# Altium integrated library LEMO Unipole And Multipole Type Connectors.IntLib: 1566 symbols (part 8 of 13) (continued)
## PKA.M1.0GL.VG
designator J?
Fixed receptacle with two nuts (back panel mounting), 90° print contacts, Key (A), P series, Multipole Type with 10 Contacts; Manufacturer: LEMO; PartNumber: PKA.M1.0GL.VG; Number of contacts: 10; Contact Diameter: 0.5 mm; Test voltage (kV rms) Contact-Contact: 0.85; Rated Current(A): 3; DatasheetVersion: Jun-14; PackageReference: PKA.M1.0GL.VG; PackageDescription: Fixed receptacle with two nuts (back panel mounting), 90° print contacts, Key(A) for Printed Circuit; ComponentLink1Description: Manufacturer URL; ComponentLink1URL: http://www.lemo.com; ComponentLink2Description: Datasheet; ComponentLink2URL: http://intra.lemo.ch/catalog/ROW/UK_English/P_series_catalog.pdf
footprint PKA.M1.0GL.VG (Socket, Female, Height 33.5 mm, Through hole)
pins: 1, 2, 3, 4, 5, 6, 7, 8, 9, 10

## PKA.M1.0GL.VJ
designator J?
Fixed receptacle with two nuts (back panel mounting), 90° print contacts, Key (A), P series, Multipole Type with 10 Contacts; Manufacturer: LEMO; PartNumber: PKA.M1.0GL.VJ; Number of contacts: 10; Contact Diameter: 0.5 mm; Test voltage (kV rms) Contact-Contact: 0.85; Rated Current(A): 3; DatasheetVersion: Jun-14; PackageReference: PKA.M1.0GL.VJ; PackageDescription: Fixed receptacle with two nuts (back panel mounting), 90° print contacts, Key(A) for Printed Circuit; ComponentLink1Description: Manufacturer URL; ComponentLink1URL: http://www.lemo.com; ComponentLink2Description: Datasheet; ComponentLink2URL: http://intra.lemo.ch/catalog/ROW/UK_English/P_series_catalog.pdf
footprint PKA.M1.0GL.VJ (Socket, Female, Height 33.5 mm, Through hole)
pins: 1, 2, 3, 4, 5, 6, 7, 8, 9, 10

## PKA.M1.0GL.VR
designator J?
Fixed receptacle with two nuts (back panel mounting), 90° print contacts, Key (A), P series, Multipole Type with 10 Contacts; Manufacturer: LEMO; PartNumber: PKA.M1.0GL.VR; Number of contacts: 10; Contact Diameter: 0.5 mm; Test voltage (kV rms) Contact-Contact: 0.85; Rated Current(A): 3; DatasheetVersion: Jun-14; PackageReference: PKA.M1.0GL.VR; PackageDescription: Fixed receptacle with two nuts (back panel mounting), 90° print contacts, Key(A) for Printed Circuit; ComponentLink1Description: Manufacturer URL; ComponentLink1URL: http://www.lemo.com; ComponentLink2Description: Datasheet; ComponentLink2URL: http://intra.lemo.ch/catalog/ROW/UK_English/P_series_catalog.pdf
footprint PKA.M1.0GL.VR (Socket, Female, Height 33.5 mm, Through hole)
pins: 1, 2, 3, 4, 5, 6, 7, 8, 9, 10

## PKA.M1.0GL.VZ
designator J?
Fixed receptacle with 1 nut (without 2nd front nut), Key (A), P series, Multipole Type with 10 Contacts; Manufacturer: LEMO; PartNumber: PKA.M1.0GL.VZ; Number of contacts: 10; Contact Diameter: 0.5 mm; Test voltage (kV rms) Contact-Contact: 0.85; Rated Current(A): 3; DatasheetVersion: Jun-14; PackageReference: PKA.M1.0GL.VZ; PackageDescription: Fixed receptacle with 1 nut (without 2nd front nut), Key(A) for Printed Circuit; ComponentLink1Description: Manufacturer URL; ComponentLink1URL: http://www.lemo.com; ComponentLink2Description: Datasheet; ComponentLink2URL: http://intra.lemo.ch/catalog/ROW/UK_English/P_series_catalog.pdf
footprint PKA.M1.0GL.VZ (Socket, Female, Height 33.5 mm, Through hole)
pins: 1, 2, 3, 4, 5, 6, 7, 8, 9, 10

## PKA.M1.0NL.NG
designator J?
Fixed receptacle with two nuts (back panel mounting), straight print contacts, Key (A), P series, Multipole Type with 10 Contacts; Manufacturer: LEMO; PartNumber: PKA.M1.0NL.NG; Number of contacts: 10; Contact Diameter: 0.5 mm; Test voltage (kV rms) Contact-Contact: 0.85; Rated Current(A): 3; DatasheetVersion: Jun-14; PackageReference: PKA.M1.0NL.NG; PackageDescription: Fixed receptacle with two nuts (back panel mounting), straight print contacts, Key(A) for Printed Circuit; ComponentLink1Description: Manufacturer URL; ComponentLink1URL: http://www.lemo.com; ComponentLink2Description: Datasheet; ComponentLink2URL: http://intra.lemo.ch/catalog/ROW/UK_English/P_series_catalog.pdf
footprint PKA.M1.0NL.NG (Socket, Female, Height 33.5 mm, Through hole)
pins: 1, 2, 3, 4, 5, 6, 7, 8, 9, 10

## PKA.M1.0NL.VN
designator J?
Fixed receptacle with two nuts (back panel mounting), 90° print contacts, Key (A), P series, Multipole Type with 10 Contacts; Manufacturer: LEMO; PartNumber: PKA.M1.0NL.VN; Number of contacts: 10; Contact Diameter: 0.5 mm; Test voltage (kV rms) Contact-Contact: 0.85; Rated Current(A): 3; DatasheetVersion: Jun-14; PackageReference: PKA.M1.0NL.VN; PackageDescription: Fixed receptacle with two nuts (back panel mounting), 90° print contacts, Key(A) for Printed Circuit; Supplier 1: Mouser; Supplier Part Number 1: 736-PKAM10NLVN; Supplier 2: Digi-Key; Supplier Part Number 2: PKA.M1.0NL.VN-ND; ComponentLink1Description: Manufacturer URL; ComponentLink1URL: http://www.lemo.com; ComponentLink2Description: Datasheet; ComponentLink2URL: http://intra.lemo.ch/catalog/ROW/UK_English/P_series_catalog.pdf
footprint PKA.M1.0NL.VN (Socket, Female, Height 33.5 mm, Through hole)
pins: 1, 2, 3, 4, 5, 6, 7, 8, 9, 10

## PKA.M1.0NL.VZ
designator J?
Fixed receptacle with 1 nut (without 2nd front nut), Key (A), P series, Multipole Type with 10 Contacts; Manufacturer: LEMO; PartNumber: PKA.M1.0NL.VZ; Number of contacts: 10; Contact Diameter: 0.5 mm; Test voltage (kV rms) Contact-Contact: 0.85; Rated Current(A): 3; DatasheetVersion: Jun-14; PackageReference: PKA.M1.0NL.VZ; PackageDescription: Fixed receptacle with 1 nut (without 2nd front nut), Key(A) for Printed Circuit; ComponentLink1Description: Manufacturer URL; ComponentLink1URL: http://www.lemo.com; ComponentLink2Description: Datasheet; ComponentLink2URL: http://intra.lemo.ch/catalog/ROW/UK_English/P_series_catalog.pdf
footprint PKA.M1.0NL.VZ (Socket, Female, Height 33.5 mm, Through hole)
pins: 1, 2, 3, 4, 5, 6, 7, 8, 9, 10

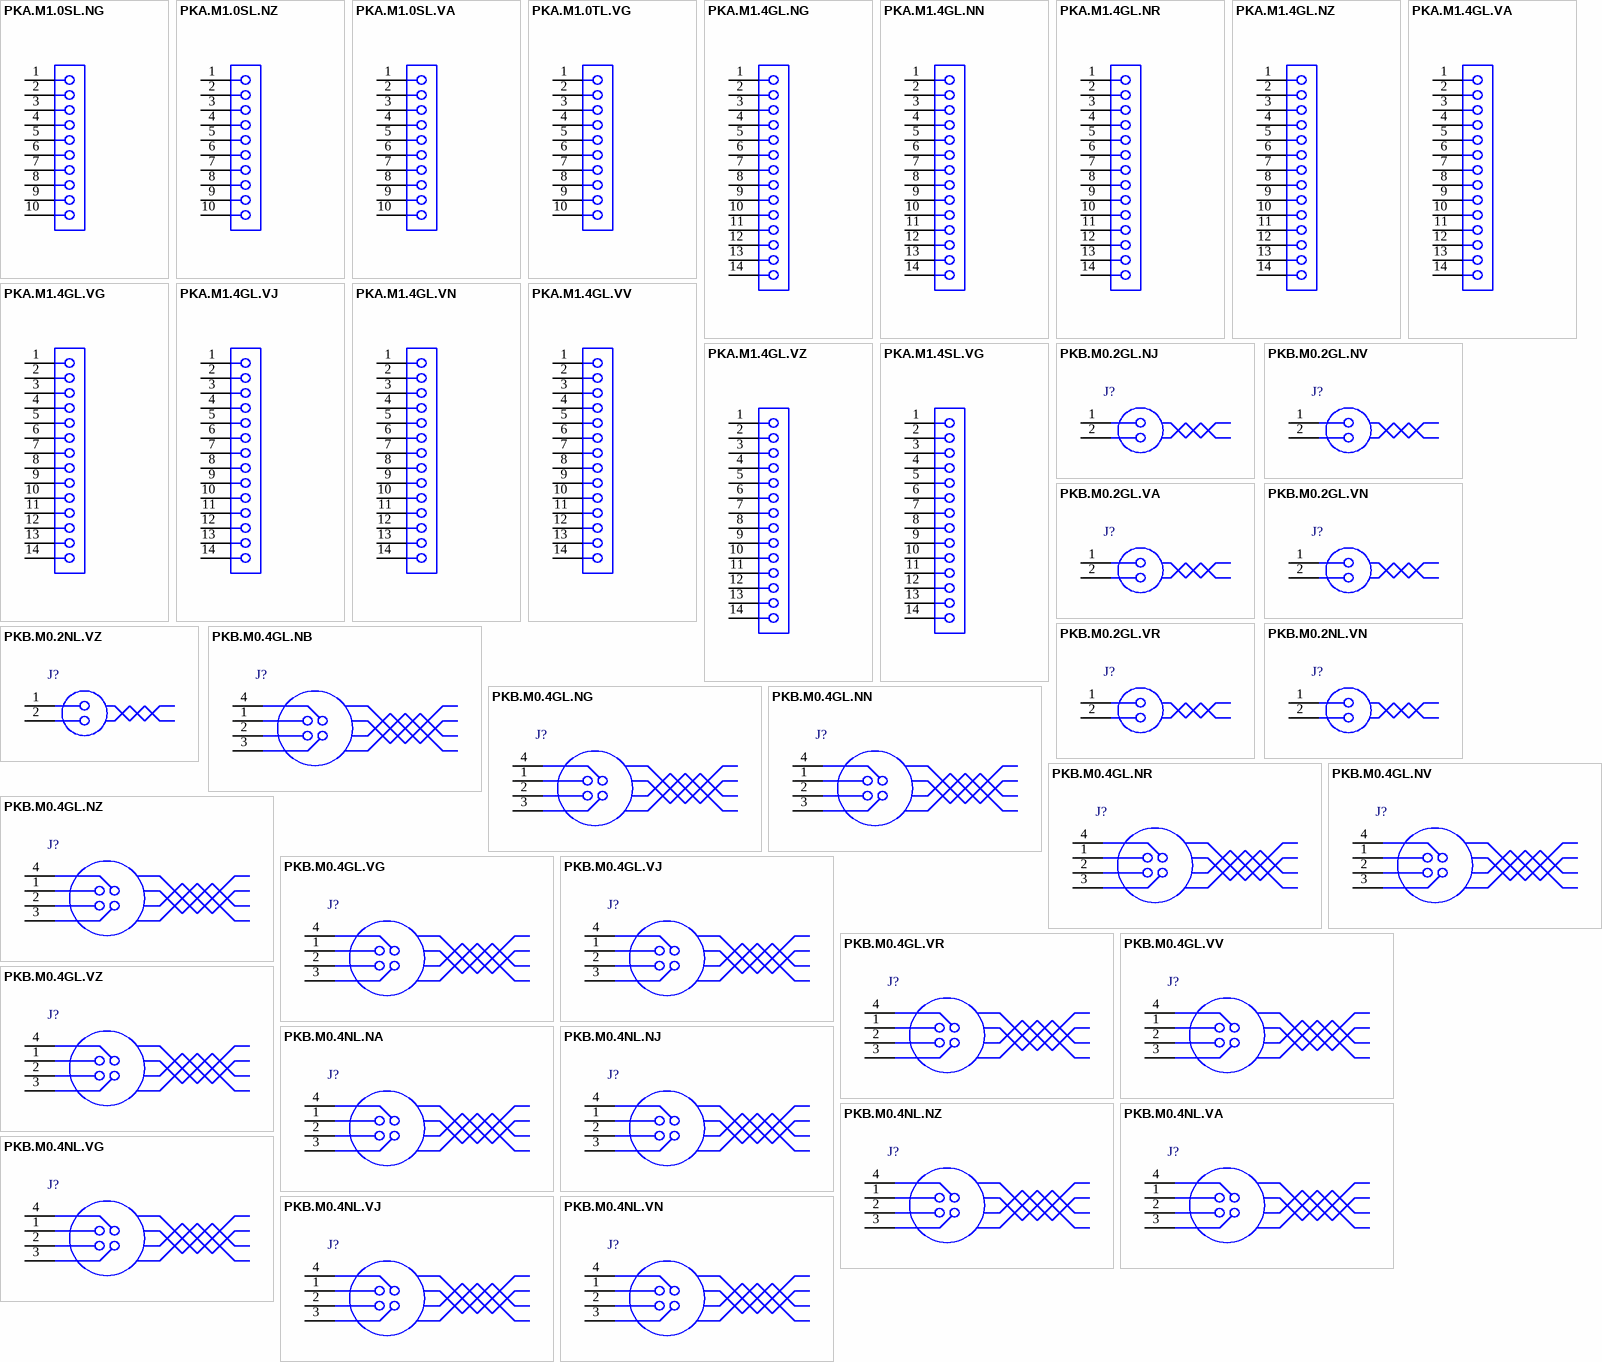
[diagram p27: symbols PKA.M1.0SL.NG to PKB.M0.4NL.VN]

## PKA.M1.0SL.NG
designator J?
Fixed receptacle with two nuts (back panel mounting), straight print contacts, Key (A),  series, Multipole Type with 10 Contacts; Manufacturer: LEMO; PartNumber: PKA.M1.0SL.NG; Number of contacts: 10; Contact Diameter: 0.5 mm; Test voltage (kV rms) Contact-Contact: 0.85; Rated Current(A): 3; DatasheetVersion: Jun-14; PackageReference: PKA.M1.0SL.NG; PackageDescription: Fixed receptacle with two nuts (back panel mounting), straight print contacts, Key(A) for Printed Circuit; Supplier 1: Mouser; Supplier Part Number 1: 736-PKAM10SLNG; Supplier 2: Digi-Key; Supplier Part Number 2: PKA.M1.0SL.NG-ND; ComponentLink1Description: Manufacturer URL; ComponentLink1URL: http://www.lemo.com; ComponentLink2Description: Datasheet; ComponentLink2URL: http://intra.lemo.ch/catalog/ROW/UK_English/P_series_catalog.pdf
footprint PKA.M1.0SL.NG (Socket, Female, Height 33.5 mm, Through hole)
pins: 1, 2, 3, 4, 5, 6, 7, 8, 9, 10

## PKA.M1.0SL.NZ
designator J?
Fixed receptacle with 1 nut (without 2nd front nut), Key (A), P series, Multipole Type with 10 Contacts; Manufacturer: LEMO; PartNumber: PKA.M1.0SL.NZ; Number of contacts: 10; Contact Diameter: 0.5 mm; Test voltage (kV rms) Contact-Contact: 0.85; Rated Current(A): 3; DatasheetVersion: Jun-14; PackageReference: PKA.M1.0SL.NZ; PackageDescription: Fixed receptacle with 1 nut (without 2nd front nut), Key(A) for Printed Circuit; Supplier 1: Mouser; Supplier Part Number 1: 736-PKAM10SLNZ; Supplier 2: Digi-Key; Supplier Part Number 2: PKA.M1.0SL.NZ-ND; ComponentLink1Description: Manufacturer URL; ComponentLink1URL: http://www.lemo.com; ComponentLink2Description: Datasheet; ComponentLink2URL: http://intra.lemo.ch/catalog/ROW/UK_English/P_series_catalog.pdf
footprint PKA.M1.0SL.NZ (Socket, Female, Height 25 mm, Through hole)
pins: 1, 2, 3, 4, 5, 6, 7, 8, 9, 10

## PKA.M1.0SL.VA
designator J?
Fixed receptacle with two nuts (back panel mounting), 90° print contacts, Key (A), P series, Multipole Type with 10 Contacts; Manufacturer: LEMO; PartNumber: PKA.M1.0SL.VA; Number of contacts: 10; Contact Diameter: 0.5 mm; Test voltage (kV rms) Contact-Contact: 0.85; Rated Current(A): 3; DatasheetVersion: Jun-14; PackageReference: PKA.M1.0SL.VA; PackageDescription: Fixed receptacle with two nuts (back panel mounting), 90° print contacts, Key(A) for Printed Circuit; Supplier 1: Mouser; Supplier Part Number 1: 736-PKAM10SLVA; Supplier 2: Digi-Key; Supplier Part Number 2: PKA.M1.0SL.VA-ND; ComponentLink1Description: Manufacturer URL; ComponentLink1URL: http://www.lemo.com; ComponentLink2Description: Datasheet; ComponentLink2URL: http://intra.lemo.ch/catalog/ROW/UK_English/P_series_catalog.pdf
footprint PKA.M1.0SL.VA (Socket, Female, Height 33.5 mm, Through hole)
pins: 1, 2, 3, 4, 5, 6, 7, 8, 9, 10

## PKA.M1.0TL.VG
designator J?
Fixed receptacle with two nuts (back panel mounting), 90° print contacts, Key (A), P series, Multipole Type with 10 Contacts; Manufacturer: LEMO; PartNumber: PKA.M1.0TL.VG; Number of contacts: 10; Contact Diameter: 0.5 mm; Test voltage (kV rms) Contact-Contact: 0.85; Rated Current(A): 3; DatasheetVersion: Jun-14; PackageReference: PKA.M1.0TL.VG; PackageDescription: Fixed receptacle with two nuts (back panel mounting), 90° print contacts, Key(A) for Printed Circuit; Supplier 1: Mouser; Supplier Part Number 1: 736-PKAM10TLVG; Supplier 2: Digi-Key; Supplier Part Number 2: PKA.M1.0TL.VG-ND; ComponentLink1Description: Manufacturer URL; ComponentLink1URL: http://www.lemo.com; ComponentLink2Description: Datasheet; ComponentLink2URL: http://intra.lemo.ch/catalog/ROW/UK_English/P_series_catalog.pdf
footprint PKA.M1.0TL.VG (Socket, Female, Height 33.5 mm, Through hole)
pins: 1, 2, 3, 4, 5, 6, 7, 8, 9, 10

## PKA.M1.4GL.NG
designator J?
Fixed receptacle with two nuts (back panel mounting), straight print contacts, Key (A), P series, Multipole Type with 14 Contacts; Manufacturer: LEMO; PartNumber: PKA.M1.4GL.NG; Number of contacts: 14; Contact Diameter: 0.5 mm; Test voltage (kV rms) Contact-Contact: 0.6; Rated Current(A): 2; DatasheetVersion: Jun-14; PackageReference: PKA.M1.4GL.NG; PackageDescription: Fixed receptacle with two nuts (back panel mounting), straight print contacts, Key(A) for Printed Circuit; ComponentLink1Description: Manufacturer URL; ComponentLink1URL: http://www.lemo.com; ComponentLink2Description: Datasheet; ComponentLink2URL: http://intra.lemo.ch/catalog/ROW/UK_English/P_series_catalog.pdf
footprint PKA.M1.4GL.NG (Socket, Female, Height 33.5 mm, Through hole)
pins: 1, 2, 3, 4, 5, 6, 7, 8, 9, 10, 11, 12, 13, 14

## PKA.M1.4GL.NN
designator J?
Fixed receptacle with two nuts (back panel mounting), straight print contacts, Key (A), P series, Multipole Type with 14 Contacts; Manufacturer: LEMO; PartNumber: PKA.M1.4GL.NN; Number of contacts: 14; Contact Diameter: 0.5 mm; Test voltage (kV rms) Contact-Contact: 0.6; Rated Current(A): 2; DatasheetVersion: Jun-14; PackageReference: PKA.M1.4GL.NN; PackageDescription: Fixed receptacle with two nuts (back panel mounting), straight print contacts, Key(A) for Printed Circuit; ComponentLink1Description: Manufacturer URL; ComponentLink1URL: http://www.lemo.com; ComponentLink2Description: Datasheet; ComponentLink2URL: http://intra.lemo.ch/catalog/ROW/UK_English/P_series_catalog.pdf
footprint PKA.M1.4GL.NN (Socket, Female, Height 33.5 mm, Through hole)
pins: 1, 2, 3, 4, 5, 6, 7, 8, 9, 10, 11, 12, 13, 14

## PKA.M1.4GL.NR
designator J?
Fixed receptacle with two nuts (back panel mounting), straight print contacts, Key (A), P series, Multipole Type with 14 Contacts; Manufacturer: LEMO; PartNumber: PKA.M1.4GL.NR; Number of contacts: 14; Contact Diameter: 0.5 mm; Test voltage (kV rms) Contact-Contact: 0.6; Rated Current(A): 2; DatasheetVersion: Jun-14; PackageReference: PKA.M1.4GL.NR; PackageDescription: Fixed receptacle with two nuts (back panel mounting), straight print contacts, Key(A) for Printed Circuit; ComponentLink1Description: Manufacturer URL; ComponentLink1URL: http://www.lemo.com; ComponentLink2Description: Datasheet; ComponentLink2URL: http://intra.lemo.ch/catalog/ROW/UK_English/P_series_catalog.pdf
footprint PKA.M1.4GL.NR (Socket, Female, Height 33.5 mm, Through hole)
pins: 1, 2, 3, 4, 5, 6, 7, 8, 9, 10, 11, 12, 13, 14

## PKA.M1.4GL.NZ
designator J?
Fixed receptacle with 1 nut (without 2nd front nut), Key (A), P series, Multipole Type with 14 Contacts; Manufacturer: LEMO; PartNumber: PKA.M1.4GL.NZ; Number of contacts: 14; Contact Diameter: 0.5 mm; Test voltage (kV rms) Contact-Contact: 0.6; Rated Current(A): 2; DatasheetVersion: Jun-14; PackageReference: PKA.M1.4GL.NZ; PackageDescription: Fixed receptacle with 1 nut (without 2nd front nut), Key(A) for Printed Circuit; ComponentLink1Description: Manufacturer URL; ComponentLink1URL: http://www.lemo.com; ComponentLink2Description: Datasheet; ComponentLink2URL: http://intra.lemo.ch/catalog/ROW/UK_English/P_series_catalog.pdf
footprint PKA.M1.4GL.NZ (Socket, Female, Height 25 mm, Through hole)
pins: 1, 2, 3, 4, 5, 6, 7, 8, 9, 10, 11, 12, 13, 14

## PKA.M1.4GL.VA
designator J?
Fixed receptacle with two nuts (back panel mounting), 90° print contacts, Key (A), P series, Multipole Type with 14 Contacts; Manufacturer: LEMO; PartNumber: PKA.M1.4GL.VA; Number of contacts: 14; Contact Diameter: 0.5 mm; Test voltage (kV rms) Contact-Contact: 0.6; Rated Current(A): 2; DatasheetVersion: Jun-14; PackageReference: PKA.M1.4GL.VA; PackageDescription: Fixed receptacle with two nuts (back panel mounting), 90° print contacts, Key(A) for Printed Circuit; ComponentLink1Description: Manufacturer URL; ComponentLink1URL: http://www.lemo.com; ComponentLink2Description: Datasheet; ComponentLink2URL: http://intra.lemo.ch/catalog/ROW/UK_English/P_series_catalog.pdf
footprint PKA.M1.4GL.VA (Socket, Female, Height 33.5 mm, Through hole)
pins: 1, 2, 3, 4, 5, 6, 7, 8, 9, 10, 11, 12, 13, 14

## PKA.M1.4GL.VG
designator J?
Fixed receptacle with two nuts (back panel mounting), 90° print contacts, Key (A), P series, Multipole Type with 14 Contacts; Manufacturer: LEMO; PartNumber: PKA.M1.4GL.VG; Number of contacts: 14; Contact Diameter: 0.5 mm; Test voltage (kV rms) Contact-Contact: 0.6; Rated Current(A): 2; DatasheetVersion: Jun-14; PackageReference: PKA.M1.4GL.VG; PackageDescription: Fixed receptacle with two nuts (back panel mounting), 90° print contacts, Key(A) for Printed Circuit; ComponentLink1Description: Manufacturer URL; ComponentLink1URL: http://www.lemo.com; ComponentLink2Description: Datasheet; ComponentLink2URL: http://intra.lemo.ch/catalog/ROW/UK_English/P_series_catalog.pdf
footprint PKA.M1.4GL.VG (Socket, Female, Height 33.5 mm, Through hole)
pins: 1, 2, 3, 4, 5, 6, 7, 8, 9, 10, 11, 12, 13, 14

## PKA.M1.4GL.VJ
designator J?
Fixed receptacle with two nuts (back panel mounting), 90° print contacts, Key (A),  series, Multipole Type with 14 Contacts; Manufacturer: LEMO; PartNumber: PKA.M1.4GL.VJ; Number of contacts: 14; Contact Diameter: 0.5 mm; Test voltage (kV rms) Contact-Contact: 0.6; Rated Current(A): 2; DatasheetVersion: Jun-14; PackageReference: PKA.M1.4GL.VJ; PackageDescription: Fixed receptacle with two nuts (back panel mounting), 90° print contacts, Key(A) for Printed Circuit; ComponentLink1Description: Manufacturer URL; ComponentLink1URL: http://www.lemo.com; ComponentLink2Description: Datasheet; ComponentLink2URL: http://intra.lemo.ch/catalog/ROW/UK_English/P_series_catalog.pdf
footprint PKA.M1.4GL.VJ (Socket, Female, Height 33.5 mm, Through hole)
pins: 1, 2, 3, 4, 5, 6, 7, 8, 9, 10, 11, 12, 13, 14

## PKA.M1.4GL.VN
designator J?
Fixed receptacle with two nuts (back panel mounting), 90° print contacts, Key (A), P series, Multipole Type with 14 Contacts; Manufacturer: LEMO; PartNumber: PKA.M1.4GL.VN; Number of contacts: 14; Contact Diameter: 0.5 mm; Test voltage (kV rms) Contact-Contact: 0.6; Rated Current(A): 2; DatasheetVersion: Jun-14; PackageReference: PKA.M1.4GL.VN; PackageDescription: Fixed receptacle with two nuts (back panel mounting), 90° print contacts, Key(A) for Printed Circuit; ComponentLink1Description: Manufacturer URL; ComponentLink1URL: http://www.lemo.com; ComponentLink2Description: Datasheet; ComponentLink2URL: http://intra.lemo.ch/catalog/ROW/UK_English/P_series_catalog.pdf
footprint PKA.M1.4GL.VN (Socket, Female, Height 33.5 mm, Through hole)
pins: 1, 2, 3, 4, 5, 6, 7, 8, 9, 10, 11, 12, 13, 14

## PKA.M1.4GL.VV
designator J?
Fixed receptacle with two nuts (back panel mounting), 90° print contacts, Key (A), P series, Multipole Type with 14 Contacts; Manufacturer: LEMO; PartNumber: PKA.M1.4GL.VV; Number of contacts: 14; Contact Diameter: 0.5 mm; Test voltage (kV rms) Contact-Contact: 0.6; Rated Current(A): 2; DatasheetVersion: Jun-14; PackageReference: PKA.M1.4GL.VV; PackageDescription: Fixed receptacle with two nuts (back panel mounting), 90° print contacts, Key(A) for Printed Circuit; ComponentLink1Description: Manufacturer URL; ComponentLink1URL: http://www.lemo.com; ComponentLink2Description: Datasheet; ComponentLink2URL: http://intra.lemo.ch/catalog/ROW/UK_English/P_series_catalog.pdf
footprint PKA.M1.4GL.VV (Socket, Female, Height 33.5 mm, Through hole)
pins: 1, 2, 3, 4, 5, 6, 7, 8, 9, 10, 11, 12, 13, 14

## PKA.M1.4GL.VZ
designator J?
Fixed receptacle with 1 nut (without 2nd front nut), Key (A), P series, Multipole Type with 14 Contacts; Manufacturer: LEMO; PartNumber: PKA.M1.4GL.VZ; Number of contacts: 14; Contact Diameter: 0.5 mm; Test voltage (kV rms) Contact-Contact: 0.6; Rated Current(A): 2; DatasheetVersion: Jun-14; PackageReference: PKA.M1.4GL.VZ; PackageDescription: Fixed receptacle with 1 nut (without 2nd front nut), Key(A) for Printed Circuit; ComponentLink1Description: Manufacturer URL; ComponentLink1URL: http://www.lemo.com; ComponentLink2Description: Datasheet; ComponentLink2URL: http://intra.lemo.ch/catalog/ROW/UK_English/P_series_catalog.pdf
footprint PKA.M1.4GL.VZ (Socket, Female, Height 33.5 mm, Through hole)
pins: 1, 2, 3, 4, 5, 6, 7, 8, 9, 10, 11, 12, 13, 14

## PKA.M1.4SL.VG
designator J?
Fixed receptacle with two nuts (back panel mounting), 90° print contacts, Key (A), P series, Multipole Type with 14 Contacts; Manufacturer: LEMO; PartNumber: PKA.M1.4SL.VG; Number of contacts: 14; Contact Diameter: 0.5 mm; Test voltage (kV rms) Contact-Contact: 0.6; Rated Current(A): 2; DatasheetVersion: Jun-14; PackageReference: PKA.M1.4SL.VG; PackageDescription: Fixed receptacle with two nuts (back panel mounting), 90° print contacts, Key(A) for Printed Circuit; Supplier 1: Mouser; Supplier Part Number 1: 736-PKA.M1.4SL.VG; Supplier 2: Digi-Key; Supplier Part Number 2: PKA.M1.4SL.VG-ND; ComponentLink1Description: Manufacturer URL; ComponentLink1URL: http://www.lemo.com; ComponentLink2Description: Datasheet; ComponentLink2URL: http://intra.lemo.ch/catalog/ROW/UK_English/P_series_catalog.pdf
footprint PKA.M1.4SL.VG (Socket, Female, Through hole)
pins: 1, 2, 3, 4, 5, 6, 7, 8, 9, 10, 11, 12, 13, 14

## PKB.M0.2GL.NJ
designator J?
Fixed receptacle with two nuts (back panel mounting), straight print contacts, Key (B), P series, Multipole Type with 2 Contacts; Manufacturer: LEMO; PartNumber: PKB.M0.2GL.NJ; Number of contacts: 2; Contact Diameter: 1.3 mm; Test voltage (kV rms) Contact-Contact: 1.2; Rated Current(A): 10; DatasheetVersion: Jun-14; PackageReference: PKB.M0.2GL.NJ; PackageDescription: Fixed receptacle with two nuts (back panel mounting), straight print contacts, Key(B) for Printed Circuit; ComponentLink1Description: Manufacturer URL; ComponentLink1URL: http://www.lemo.com; ComponentLink2Description: Datasheet; ComponentLink2URL: http://intra.lemo.ch/catalog/ROW/UK_English/P_series_catalog.pdf
footprint PKB.M0.2GL.NJ (Socket, Female, Height 33.5 mm, Through hole)
pins: 1, 2

## PKB.M0.2GL.NV
designator J?
Fixed receptacle with two nuts (back panel mounting), straight print contacts, Key (B), P series, Multipole Type with 2 Contacts; Manufacturer: LEMO; PartNumber: PKB.M0.2GL.NV; Number of contacts: 2; Contact Diameter: 1.3 mm; Test voltage (kV rms) Contact-Contact: 1.2; Rated Current(A): 10; DatasheetVersion: Jun-14; PackageReference: PKB.M0.2GL.NV; PackageDescription: Fixed receptacle with two nuts (back panel mounting), straight print contacts, Key(B) for Printed Circuit; ComponentLink1Description: Manufacturer URL; ComponentLink1URL: http://www.lemo.com; ComponentLink2Description: Datasheet; ComponentLink2URL: http://intra.lemo.ch/catalog/ROW/UK_English/P_series_catalog.pdf
footprint PKB.M0.2GL.NV (Socket, Female, Height 33.5 mm, Through hole)
pins: 1, 2

## PKB.M0.2GL.VA
designator J?
Fixed receptacle with two nuts (back panel mounting), 90° print contacts, Key (B), P series, Multipole Type with 2 Contacts; Manufacturer: LEMO; PartNumber: PKB.M0.2GL.VA; Number of contacts: 2; Contact Diameter: 1.3 mm; Test voltage (kV rms) Contact-Contact: 1.2; Rated Current(A): 10; DatasheetVersion: Jun-14; PackageReference: PKB.M0.2GL.VA; PackageDescription: Fixed receptacle with two nuts (back panel mounting), 90° print contacts, Key(B) for Printed Circuit; ComponentLink1Description: Manufacturer URL; ComponentLink1URL: http://www.lemo.com; ComponentLink2Description: Datasheet; ComponentLink2URL: http://intra.lemo.ch/catalog/ROW/UK_English/P_series_catalog.pdf
footprint PKB.M0.2GL.VA (Socket, Female, Height 33.5 mm, Through hole)
pins: 1, 2

## PKB.M0.2GL.VN
designator J?
Fixed receptacle with two nuts (back panel mounting), 90° print contacts, Key (B), P series, Multipole Type with 2 Contacts; Manufacturer: LEMO; PartNumber: PKB.M0.2GL.VN; Number of contacts: 2; Contact Diameter: 1.3 mm; Test voltage (kV rms) Contact-Contact: 1.2; Rated Current(A): 10; DatasheetVersion: Jun-14; PackageReference: PKB.M0.2GL.VN; PackageDescription: Fixed receptacle with two nuts (back panel mounting), 90° print contacts, Key(B) for Printed Circuit; ComponentLink1Description: Manufacturer URL; ComponentLink1URL: http://www.lemo.com; ComponentLink2Description: Datasheet; ComponentLink2URL: http://intra.lemo.ch/catalog/ROW/UK_English/P_series_catalog.pdf
footprint PKB.M0.2GL.VN (Socket, Female, Height 33.5 mm, Through hole)
pins: 1, 2

## PKB.M0.2GL.VR
designator J?
Fixed receptacle with two nuts (back panel mounting), 90° print contacts, Key (B), P series, Multipole Type with 2 Contacts; Manufacturer: LEMO; PartNumber: PKB.M0.2GL.VR; Number of contacts: 2; Contact Diameter: 1.3 mm; Test voltage (kV rms) Contact-Contact: 1.2; Rated Current(A): 10; DatasheetVersion: Jun-14; PackageReference: PKB.M0.2GL.VR; PackageDescription: Fixed receptacle with two nuts (back panel mounting), 90° print contacts, Key(B) for Printed Circuit; ComponentLink1Description: Manufacturer URL; ComponentLink1URL: http://www.lemo.com; ComponentLink2Description: Datasheet; ComponentLink2URL: http://intra.lemo.ch/catalog/ROW/UK_English/P_series_catalog.pdf
footprint PKB.M0.2GL.VR (Socket, Female, Height 33.5 mm, Through hole)
pins: 1, 2

## PKB.M0.2NL.VN
designator J?
Fixed receptacle with two nuts (back panel mounting), 90° print contacts, Key (B),  series, Multipole Type with 2 Contacts; Manufacturer: LEMO; PartNumber: PKB.M0.2NL.VN; Number of contacts: 2; Contact Diameter: 1.3 mm; Test voltage (kV rms) Contact-Contact: 1.2; Rated Current(A): 10; DatasheetVersion: Jun-14; PackageReference: PKB.M0.2NL.VN; PackageDescription: Fixed receptacle with two nuts (back panel mounting), 90° print contacts, Key(B) for Printed Circuit; ComponentLink1Description: Manufacturer URL; ComponentLink1URL: http://www.lemo.com; ComponentLink2Description: Datasheet; ComponentLink2URL: http://intra.lemo.ch/catalog/ROW/UK_English/P_series_catalog.pdf
footprint PKB.M0.2NL.VN (Socket, Female, Height 33.5 mm, Through hole)
pins: 1, 2

## PKB.M0.2NL.VZ
designator J?
Fixed receptacle with 1 nut (without 2nd front nut), Key (B), P series, Multipole Type with 2 Contacts; Manufacturer: LEMO; PartNumber: PKB.M0.2NL.VZ; Number of contacts: 2; Contact Diameter: 1.3 mm; Test voltage (kV rms) Contact-Contact: 1.2; Rated Current(A): 10; DatasheetVersion: Jun-14; PackageReference: PKB.M0.2NL.VZ; PackageDescription: Fixed receptacle with 1 nut (without 2nd front nut), Key(B) for Printed Circuit; ComponentLink1Description: Manufacturer URL; ComponentLink1URL: http://www.lemo.com; ComponentLink2Description: Datasheet; ComponentLink2URL: http://intra.lemo.ch/catalog/ROW/UK_English/P_series_catalog.pdf
footprint PKB.M0.2NL.VZ (Socket, Female, Height 33.5 mm, Through hole)
pins: 1, 2

## PKB.M0.4GL.NB
designator J?
Fixed receptacle with two nuts (back panel mounting), straight print contacts, Key (B), P series, Multipole Type with 4 Contacts; Manufacturer: LEMO; PartNumber: PKB.M0.4GL.NB; Number of contacts: 4; Contact Diameter: 0.9 mm; Test voltage (kV rms) Contact-Contact: 1.2; Rated Current(A): 8; DatasheetVersion: Jun-14; PackageReference: PKB.M0.4GL.NB; PackageDescription: Fixed receptacle with two nuts (back panel mounting), straight print contacts, Key(B) for Printed Circuit; ComponentLink1Description: Manufacturer URL; ComponentLink1URL: http://www.lemo.com; ComponentLink2Description: Datasheet; ComponentLink2URL: http://intra.lemo.ch/catalog/ROW/UK_English/P_series_catalog.pdf
footprint PKB.M0.4GL.NB (Socket, Female, Height 33.5 mm, Through hole)
pins: 1, 2, 3, 4

## PKB.M0.4GL.NG
designator J?
Fixed receptacle with two nuts (back panel mounting), straight print contacts, Key (B), P series, Multipole Type with 4 Contacts; Manufacturer: LEMO; PartNumber: PKB.M0.4GL.NG; Number of contacts: 4; Contact Diameter: 0.9 mm; Test voltage (kV rms) Contact-Contact: 1.2; Rated Current(A): 8; DatasheetVersion: Jun-14; PackageReference: PKB.M0.4GL.NG; PackageDescription: Fixed receptacle with two nuts (back panel mounting), straight print contacts, Key(B) for Printed Circuit; ComponentLink1Description: Manufacturer URL; ComponentLink1URL: http://www.lemo.com; ComponentLink2Description: Datasheet; ComponentLink2URL: http://intra.lemo.ch/catalog/ROW/UK_English/P_series_catalog.pdf
footprint PKB.M0.4GL.NG (Socket, Female, Height 33.5 mm, Through hole)
pins: 1, 2, 3, 4

## PKB.M0.4GL.NN
designator J?
Fixed receptacle with two nuts (back panel mounting), straight print contacts, Key (B), P series, Multipole Type with 4 Contacts; Manufacturer: LEMO; PartNumber: PKB.M0.4GL.NN; Number of contacts: 4; Contact Diameter: 0.9 mm; Test voltage (kV rms) Contact-Contact: 1.2; Rated Current(A): 8; DatasheetVersion: Jun-14; PackageReference: PKB.M0.4GL.NN; PackageDescription: Fixed receptacle with two nuts (back panel mounting), straight print contacts, Key(B) for Printed Circuit; ComponentLink1Description: Manufacturer URL; ComponentLink1URL: http://www.lemo.com; ComponentLink2Description: Datasheet; ComponentLink2URL: http://intra.lemo.ch/catalog/ROW/UK_English/P_series_catalog.pdf
footprint PKB.M0.4GL.NN (Socket, Female, Height 33.5 mm, Through hole)
pins: 1, 2, 3, 4

## PKB.M0.4GL.NR
designator J?
Fixed receptacle with two nuts (back panel mounting), straight print contacts, Key (B), P series, Multipole Type with 4 Contacts; Manufacturer: LEMO; PartNumber: PKB.M0.4GL.NR; Number of contacts: 4; Contact Diameter: 0.9 mm; Test voltage (kV rms) Contact-Contact: 1.2; Rated Current(A): 8; DatasheetVersion: Jun-14; PackageReference: PKB.M0.4GL.NR; PackageDescription: Fixed receptacle with two nuts (back panel mounting), straight print contacts, Key(B) for Printed Circuit; ComponentLink1Description: Manufacturer URL; ComponentLink1URL: http://www.lemo.com; ComponentLink2Description: Datasheet; ComponentLink2URL: http://intra.lemo.ch/catalog/ROW/UK_English/P_series_catalog.pdf
footprint PKB.M0.4GL.NR (Socket, Female, Height 33.5 mm, Through hole)
pins: 1, 2, 3, 4

## PKB.M0.4GL.NV
designator J?
Fixed receptacle with two nuts (back panel mounting), straight print contacts, Key (B), P series, Multipole Type with 4 Contacts; Manufacturer: LEMO; PartNumber: PKB.M0.4GL.NV; Number of contacts: 4; Contact Diameter: 0.9 mm; Test voltage (kV rms) Contact-Contact: 1.2; Rated Current(A): 8; DatasheetVersion: Jun-14; PackageReference: PKB.M0.4GL.NV; PackageDescription: Fixed receptacle with two nuts (back panel mounting), straight print contacts, Key(B) for Printed Circuit; ComponentLink1Description: Manufacturer URL; ComponentLink1URL: http://www.lemo.com; ComponentLink2Description: Datasheet; ComponentLink2URL: http://intra.lemo.ch/catalog/ROW/UK_English/P_series_catalog.pdf
footprint PKB.M0.4GL.NV (Socket, Female, Height 33.5 mm, Through hole)
pins: 1, 2, 3, 4